# Altium footprint library miniFOC-foc_pcblib.PcbLib: 55 footprints (part 1 of 4)
Each footprint in its own frame and in the unit in brackets; x right, y up, seen from the top. Pads: shape width x height; smd on the part's side, far side on the other; paste and mask are expansions set on the pad; w line width, h text height; cw(c..) or ccw(c..) is an arc to the next point about the centre after c.
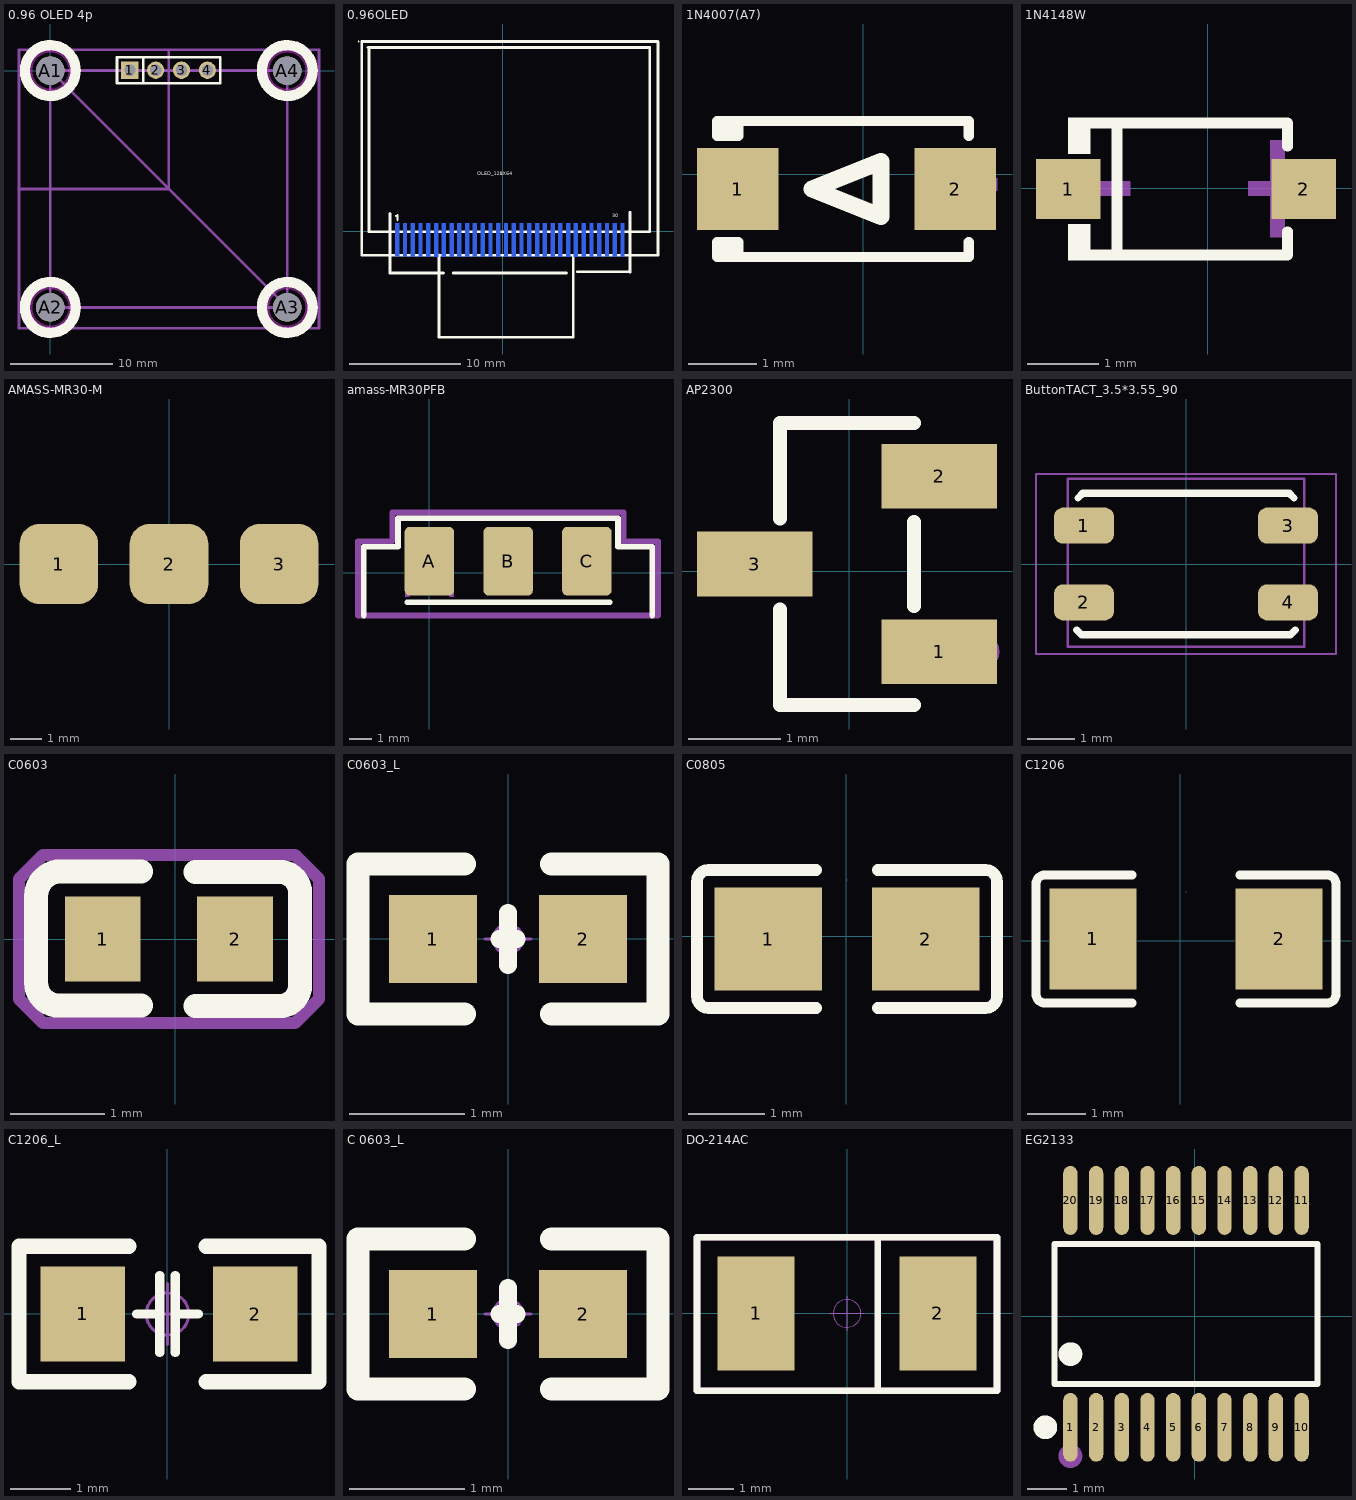
[diagram p0: the footprints below, top view; thin cyan lines are the x and y axes]

## 0.96 OLED 4p [mm]
pads (8):
  rect 1.7x1.7 hole 1.1: 1(7.822,0.034)
  round 1.7 hole 1.1: 2(10.362,0.034) 3(12.902,0.034) 4(15.442,0.034)
  round 2.8 hole 2.8: A1(0,0) A2(0,-23.3) A3(23.3,-23.3) A4(23.3,0)
Top Overlay:
  circle w1: c0,-23.3 r2.5
  circle w1: c23.3,-23.3 r2.5
  circle w1: c23.3,0 r2.5
  circle w1: c0,0 r2.5
  lines w0.254: 9.118,-1.211 9.118,1.202 ; 6.552,-1.236 16.712,-1.236 16.712,1.304 6.552,1.304 6.552,-1.236
Keep-Out Layer:
  circle w0.254: c0,-23.3 r1.905
  circle w0.254: c23.3,-23.3 r1.905
  circle w0.254: c23.3,0 r1.905
  circle w0.254: c0,0 r1.905
Mechanical 1:
  lines w0.254: 0,-23.3 23.3,-23.3 23.3,0 0,0 0,-23.3
Mechanical 15:
  lines w0.003: 11.632,0.396 11.633,0.396
  lines w0.254: -3.082,-11.65 11.65,-11.65 11.65,1.83 ; 0,0 23.3,-23.3 ; -3.082,-25.325 -3.082,2.025 26.418,2.025 26.418,-25.325 -3.082,-25.325
3D body "0.96 OLED Module - i2C.stp": height 5.03, standoff 1, extent -2.07,-25.964 25.438,2.07
3D body "4-Pin Header - Male - 2.54mm.step": height 8.89, standoff -3.05, extent 6.552,-1.236 16.712,1.304

## 0.96OLED [mm]
pads (30):
  rect 0.351x3 smd far side mask+0.051: 1(-9.497,-0.781) 2(-8.797,-0.783) 3(-8.097,-0.783) 4(-7.397,-0.783) 5(-6.697,-0.783) 6(-5.997,-0.783) 7(-5.297,-0.783) 8(-4.597,-0.783) 9(-3.897,-0.783) 10(-3.197,-0.783) 11(-2.497,-0.783) 12(-1.797,-0.783) 13(-1.097,-0.783) 14(-0.397,-0.783) 15(0.303,-0.783) 16(1.003,-0.783) 17(1.703,-0.783) 18(2.403,-0.783) 19(3.103,-0.783) 20(3.803,-0.783) 21(4.503,-0.783) 22(5.203,-0.783) 23(5.903,-0.783) 24(6.603,-0.783) 25(7.303,-0.783) 26(8.003,-0.783) 27(8.703,-0.783) 28(9.403,-0.785) 29(10.103,-0.786) 30(10.803,-0.786)
Top Overlay:
  region: -9.667,1.346 -9.627,1.296 -9.577,1.296 -9.537,1.306 -9.547,0.966 -9.467,0.896 -9.397,0.966 -9.397,1.486 -9.447,1.536 -9.517,1.526 -9.587,1.456 -9.657,1.416
  region: -12.911,17.089 -12.911,17.114 -12.946,17.149 -12.996,17.149 -13.031,17.114 -13.031,17.089 -13.031,17.064 -12.996,17.029 -12.946,17.029 -12.911,17.064
  lines w0.254: -12.043,16.549 13.257,16.549 13.257,-0.051 -12.043,-0.051 -12.043,16.449 -12.143,16.549 -11.843,16.549 -11.443,16.549 ; -10.141,-3.757 -5.341,-3.757 ; -10.135,-3.796 -10.135,1.604 ; -5.743,-2.151 -5.743,-9.551 6.357,-9.551 6.357,-2.251 ; -4.441,-3.757 5.759,-3.757 ; 6.759,-3.657 11.459,-3.657 ; 11.465,-3.696 11.465,1.704 ; -12.701,-2.171 13.999,-2.171 13.999,17.089 -12.701,17.089 -12.701,-2.171
  text "OLED_128X64" at -2.286,5.027 h0.33
  text "30" at 9.869,1.247 h0.33
3D body "User Library-096OLED.step": height 3.16, standoff -0.68, extent -12.715,-7.028 13.985,15.188

## 1N4007(A7) [mm] "1kV 1A 1V"
pads (2):
  rect 1.2x1.2 smd: 1(-1.847,-0.216) 2(1.353,-0.216)
Top Overlay:
  lines w0.152: -2.038,-1.216 -2.038,-0.996 ; -2.038,0.565 -2.038,0.784 ; -1.938,-1.216 -1.938,-0.996 ; -1.938,0.565 -1.938,0.784 ; -1.837,-1.216 -1.837,-0.996 -2.147,-0.996 -2.147,-1.216 1.353,-1.216 1.553,-1.216 1.553,-0.996 ; -1.837,0.784 -1.837,0.565 -2.147,0.565 -2.147,0.784 1.153,0.784 ; 0.953,0.784 1.553,0.784 1.553,0.565
  lines w0.254: -0.755,-0.216 0.261,0.191 0.261,-0.622 -0.755,-0.216
Mechanical 15:
  region: -1.561,-0.309 -2.441,-0.309 -2.441,-0.129 -1.561,-0.129
  region: 1.97,-0.24 1.09,-0.24 1.09,-0.06 1.97,-0.06
  region: 1.41,-0.652 1.41,0.228 1.59,0.228 1.59,-0.652
3D body "1N4148W.STEP": height 1.15, standoff 0, extent -1.59,-0.869 1.084,0.431

## 1N4148W [mm] "SOD-123W, 100V 150mA 4ns"
pads (2):
  rect 0.91x0.84 smd: 1(-1.958,-0.013) 2(1.352,-0.013)
Top Overlay:
  region: -1.653,-0.51 -1.958,-0.51 -1.958,-1.016 -1.653,-1.016
  region: -1.653,0.483 -1.958,0.483 -1.958,0.989 -1.653,0.989
  lines w0.152: -1.729,-0.94 1.123,-0.94 1.123,-0.614 ; -1.729,0.913 1.123,0.913 1.123,0.587 ; -1.274,-0.94 -1.274,0.913
Mechanical 15:
  region: -1.905,0.093 -1.905,-0.111 -1.089,-0.111 -1.089,0.093
  region: 1.083,0.671 1.083,-0.689 0.879,-0.689 0.879,0.671
  region: 1.389,0.093 1.389,-0.111 0.573,-0.111 0.573,0.093
3D body "1N4148W.STEP": height 1.15, standoff 0, extent -1.653,-0.7 1.022,0.6

## AMASS-MR30-M [mm]
pads (3):
  rrect50% 2.5x2.54 smd: 1(-3.5,0) 2(0,0) 3(3.5,0)
3D body "User Library-Amass MR30-FB.step": height 2.6, standoff -2.6, extent -6.1,-11.842 6.1,0.658

## amass-MR30PFB [mil]
pads (3):
  rrect20% 86.61x120 smd: A(0,20) B(137.8,20) C(275.59,20)
Top Overlay:
  lines w10: -115,-75 -115,45 -55,45 -55,95 330,95 330,45 390,45 390,-75 ; -39,-52 315.33,-52
Mechanical 15:
  rectangle: -43.13,35 -35.25,42.87
  rectangle: -43.13,-43 -35.25,-35.13
  rectangle: 35,-43 42.87,-35.13
  rectangle: 35,35.13 42.87,43
  lines w10: -125,-75 -125,55 -65,55 -65,105 340,105 340,60 335,55 400,55 400,-75 -125,-75
3D body "User Library-Amass MR30-FB.step": height 102.36, standoff -102.36, extent -100.15,-453.22 380.17,38.91

## AP2300 [mm] "SOT-23, N-MOSFET, 20V, 5.2A, 1.25W, (35mΩ@2.5V,5.2A)"
pads (3):
  rect 1.25x0.7 smd: 1(0.974,-0.872) 2(0.974,1.028) 3(-1.026,0.078)
Top Overlay:
  lines w0.152: -0.752,-0.416 -0.752,-1.448 0.7,-1.448 ; -0.752,0.573 -0.752,1.605 0.7,1.605 ; 0.7,-0.377 0.7,0.534
Mechanical 15:
  circle w0.2: c1.424,-0.872 r0.1
3D body "SOT-23-3.STEP": height 1.12, standoff 0, extent -1.173,-1.389 1.197,1.531

## ButtonTACT_3.5*3.55_90 [mil]
height 169.29
pads (4):
  rrect50% 50x30 smd: 1(-85,32) 2(-85,-32) 3(85,32) 4(85,-32)
Top Overlay:
  lines w6: -91,-55 -87,-59 87,-59 91,-55 ; -90,55 -85.98,59 86,59 90,55
Mechanical 13:
  lines w2: -98.43,-68.9 -98.43,71 98.43,71 98.43,-68.9 -98.43,-68.9
Mechanical 14:
  lines w2: -125,-75 -125,75 125,75 125,-75 -125,-75
3D body "User Library-KMS231G.STEP": height 55.91, standoff -0.77, extent -90.1,-54.76 91,85

## C0603 [mm]
pads (2):
  rect 0.8x0.9 smd: 1(-0.765,0) 2(0.635,0)
Top Overlay:
  lines w0.254: -0.361,-0.704 -1.227,-0.704 cw(c-1.227,-0.461) -1.47,-0.461 -1.47,0.453 cw(c-1.208,0.453) -1.208,0.715 -0.361,0.715 ; 0.215,-0.71 1.104,-0.71 ccw(c1.104,-0.489) 1.325,-0.489 1.325,0.489 ccw(c1.105,0.489) 1.105,0.71 0.215,0.71
Mechanical 15:
  lines w0.003: -0.073,0.721 -0.072,0.722
  lines w0.127: -1.651,-0.635 -1.651,0.635 -1.397,0.889 1.27,0.889 1.524,0.635 1.524,-0.635 1.27,-0.889 -1.397,-0.889 -1.651,-0.635
3D body "C0603_040.step": height 0.4, standoff 0, extent -0.8,-0.4 0.8,0.4

## C0603_L [mil] "贴片MLCC电容"
pads (2):
  rect 30x30 smd: 1(-25.59,0) 2(25.59,0)
Top Overlay:
  lines w6: -3,0 0,0 3,0 ; 0,-9 0,9
  lines w8: -15,-25.59 -51.18,-25.59 -51.18,25.59 -15,25.59 ; 15,-25.59 51.18,-25.59 51.18,25.59 15,25.59
Mechanical 15:
  circle w1: c0,0 r5
  lines w1: -7.87,0 7.87,0 ; 0,-7.87 0,7.87
3D body "c_0603.STEP": height 32.89, standoff 0.61, extent -31.49,-16.14 31.5,16.14

## C0805 [mm]
pads (2):
  rect 1.41x1.35 smd: 1(-1.022,-0.036) 2(1.038,-0.036)
Top Overlay:
  lines w0.152: -0.393,-0.94 -1.803,-0.94 cw(c-1.803,-0.787) -1.956,-0.787 -1.956,0.715 cw(c-1.803,0.715) -1.803,0.867 -0.393,0.867 ; 0.409,-0.94 1.819,-0.94 ccw(c1.819,-0.787) 1.971,-0.787 1.971,0.715 ccw(c1.819,0.715) 1.819,0.867 0.409,0.867
Top Paste:
  region: -1.667,-0.656 -1.667,0.624 -1.617,0.674 -0.467,0.674 -0.417,0.624 -0.412,0.214 -0.862,0.214 -0.862,-0.236 -0.422,-0.236 -0.417,-0.656 -0.467,-0.706 -1.617,-0.706
  region: 0.483,-0.656 0.483,-0.236 0.928,-0.236 0.928,0.214 0.488,0.214 0.483,0.624 0.533,0.674 1.683,0.674 1.733,0.624 1.733,-0.656 1.683,-0.706 0.533,-0.706
Mechanical 15:
  lines w0.003: 0.008,0.741 0.008,0.741
3D body "C0805_085.step": height 0.85, standoff 0, extent -1.022,-0.669 0.978,0.581

## C1206 [mm]
pads (2):
  rect 1.485x1.728 smd: 1(-1.493,0.026) 2(1.692,0.026)
Top Overlay:
  lines w0.152: -0.826,-1.067 -2.311,-1.067 cw(c-2.311,-0.914) -2.464,-0.914 -2.464,0.966 cw(c-2.311,0.966) -2.311,1.118 -0.826,1.118 ; 1.026,-1.067 2.511,-1.067 ccw(c2.511,-0.914) 2.663,-0.914 2.663,0.966 ccw(c2.511,0.966) 2.511,1.118 1.026,1.118
Top Paste:
  region: 0.95,-0.738 0.95,-0.368 1.05,-0.268 1.355,-0.268 1.455,-0.168 1.455,0.22 1.355,0.32 1.05,0.32 0.95,0.42 0.95,0.79 1.05,0.89 2.335,0.89 2.435,0.79 2.435,-0.738 2.335,-0.838 1.05,-0.838
  region: -0.75,-0.738 -0.75,-0.368 -0.85,-0.268 -1.155,-0.268 -1.255,-0.168 -1.255,0.22 -1.155,0.32 -0.85,0.32 -0.75,0.42 -0.75,0.79 -0.85,0.89 -2.135,0.89 -2.235,0.79 -2.235,-0.738 -2.135,-0.838 -0.85,-0.838
Mechanical 15:
  lines w0.003: 0.1,0.835 0.1,0.836
3D body "C1206_145.step": height 1.45, standoff 0, extent -1.504,-0.774 1.696,0.826

## C1206_L [mil] "贴片MLCC电容"
pads (2):
  rect 55x62 smd: 1(-55.12,0) 2(57.09,0)
Top Overlay:
  lines w6: -20,0 -5,0 ; -5,-25 -5,25 ; 5,-25 5,25 ; 5,0 20,0
  lines w10: -25,-44 -96.46,-44 -96.46,44 -25,44 ; 25,-44 96.46,-44 ; 25,44 96.46,44 ; 98.43,-44 98.43,44
Mechanical 15:
  circle w1.97: c0,0 r13.78
  lines w1.97: -19.68,0 19.68,0 ; 0,-19.68 0,19.68
3D body "c_1206-2.STEP": height 48.64, standoff 0.61, extent -62.99,-31.88 63,31.9

## C 0603_L [mil] "无极性贴片电容"
pads (2):
  rect 30x30 smd: 1(-25.59,0) 2(25.59,0)
Top Overlay:
  lines w6: -3,0 0,0 3,0 ; 0,-9 0,9
  lines w8: -15,-25.59 -51.18,-25.59 -51.18,25.59 -15,25.59 ; 15,-25.59 51.18,-25.59 51.18,25.59 15,25.59
Mechanical 15:
  circle w1: c0,0 r5
  lines w1: -7.87,0 7.87,0 ; 0,-7.87 0,7.87
3D body "C 0603.STEP": height 31.89, standoff -0.39, extent -31.5,-16.14 31.5,16.14

## DO-214AC [mm]
height 5.6
pads (2):
  rect 1.7x2.5 smd: 1(-2,0) 2(2,0)
Top Overlay:
  lines w0.15: 0.675,-1.7 0.675,1.65 ; -3.3,-1.7 -3.3,1.675 3.3,1.675 3.3,-1.7 -3.3,-1.7
Mechanical 14:
  circle w0.003: c0,0 r0.305
  lines w0.025: -0.381,0 0.381,0 ; 0,-0.381 0,0.381
  lines w0.15: -3.3,-1.7 -3.3,1.675 3.3,1.675 3.3,-1.7 -3.3,-1.7
Mechanical 15:
  lines w0.15: -3.3,-1.7 -3.3,1.675 3.3,1.675 3.3,-1.7 -3.3,-1.7
3D body "do214ac.stp": height 1.9, standoff 0.03, extent -2.485,-1.2 2.485,1.2
3D body "do214acpad.stp": height 0.01, standoff 0.01, extent 1.15,-1.25 2.85,1.25
3D body "do214acpad.stp": height 0.01, standoff 0.01, extent -2.85,-1.25 -1.15,1.25

## EG2133 [mm] "TSSOP-20, Three-phase independent half-bridge driver chip"
pads (20):
  oval 0.364x1.742 smd: 1(-3.153,-2.804) 2(-2.503,-2.804) 3(-1.853,-2.804) 4(-1.203,-2.804) 5(-0.553,-2.804) 6(0.097,-2.804) 7(0.747,-2.804) 8(1.397,-2.804) 9(2.047,-2.804) 10(2.697,-2.804) 11(2.697,2.938) 12(2.047,2.938) 13(1.397,2.938) 14(0.747,2.938) 15(0.097,2.938) 16(-0.553,2.938) 17(-1.203,2.938) 18(-1.853,2.938) 19(-2.503,2.938) 20(-3.153,2.938)
Top Overlay:
  circle w0.3: c-3.153,-0.952 r0.15
  circle w0.3: c-3.787,-2.804 r0.15
  lines w0.152: -3.554,-1.704 -3.554,1.838 3.099,1.838 3.099,-1.704 -3.554,-1.704
Mechanical 15:
  circle w0.3: c-3.153,-3.533 r0.15
3D body "TSSOP-20.STEP": height 1.1, standoff 0, extent -3.48,-3.185 3.02,3.236